# Altium footprint library phoenix.PcbLib: 55 footprints (part 4 of 4)
Each footprint in its own frame and in the unit in brackets; x right, y up, seen from the top. Pads: shape width x height; smd on the part's side, far side on the other; paste and mask are expansions set on the pad; w line width, h text height; cw(c..) or ccw(c..) is an arc to the next point about the centre after c.
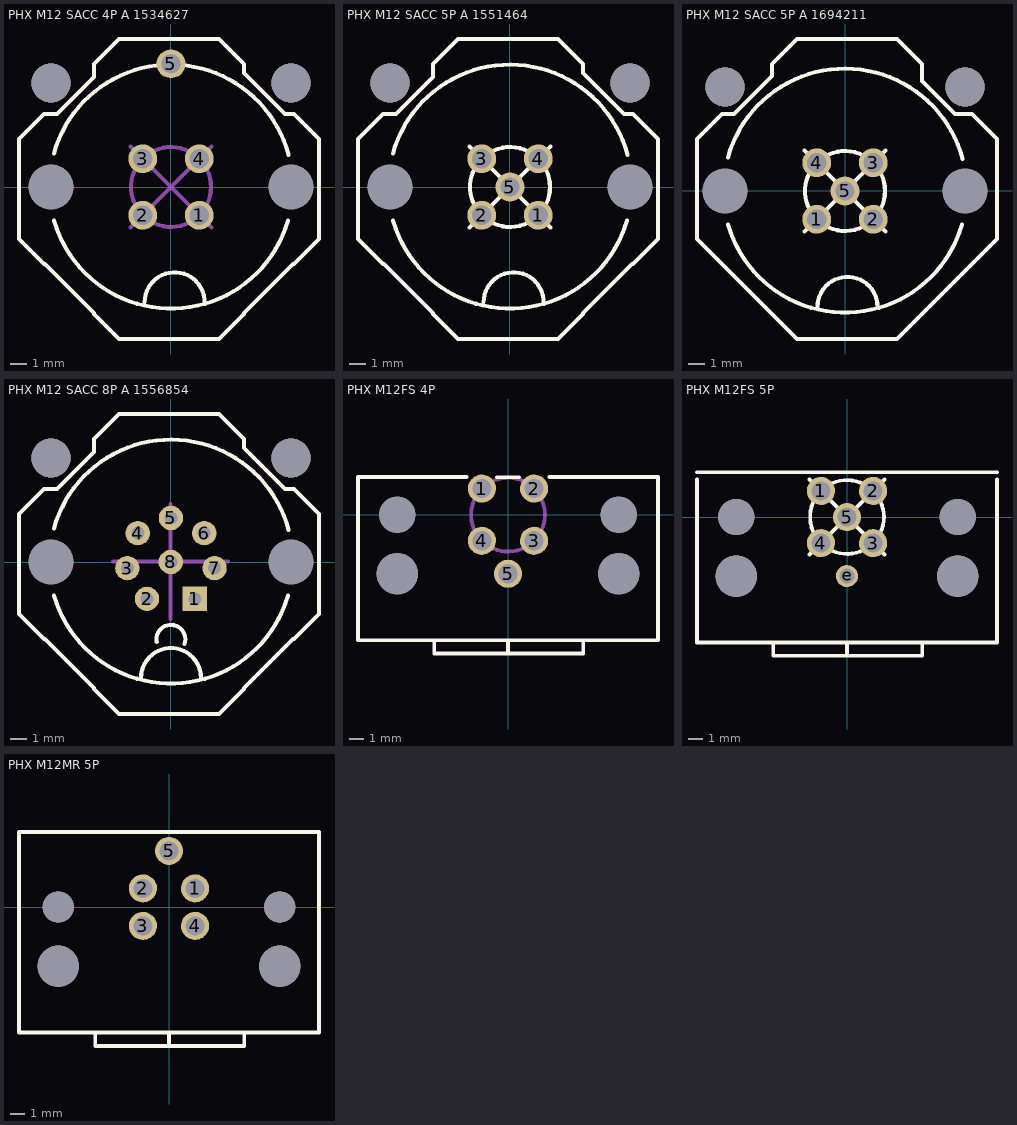
[diagram p3: the footprints below, top view; thin cyan lines are the x and y axes]

## PHX M12 SACC 4P A 1534627 [mm]
pads (9):
  round 1.8 hole 1.2: 1(1.768,-1.768) 2(-1.768,-1.768) 3(-1.768,1.768) 4(1.768,1.768) 5(0,7.7)
  round 2.8 hole 2.8 unplated: ""(-7.5,0) ""(7.5,0)
  round 2.45 hole 2.45 unplated: ""(-7.5,6.5) ""(7.5,6.5)
Top Overlay:
  lines w0.254: -7.322,2.088 cw(c0,0.05) 7.344,2.005 ; -7.303,-2.103 ccw(c0,0) 7.303,-2.104 ; -1.646,-7.204 cw(c0.229,-7.204) 2.104,-7.204 ; -9.5,-3.25 -9.5,3 -7.938,4.563 -7.121,4.563 -4.812,6.872 -4.812,7.687 -3.25,9.25 -0.75,9.25 3,9.25 4.563,7.687 4.563,7.121 7.121,4.563 7.687,4.563 9.25,3 9.25,-3.25 7.687,-4.812 7.634,-4.812 4.563,-7.883 4.563,-7.938 3,-9.5 -3.25,-9.5 -4.812,-7.938 -4.812,-7.888 -7.888,-4.812 -7.938,-4.812 -9.5,-3.25
Mechanical 1:
  circle w0.254: c0,0 r2.5
  lines w0.254: -2.54,-2.54 2.54,2.54 ; -2.54,2.54 2.54,-2.54
3D body "1534627.stp": height 24.01, standoff -5.39, extent -10,-7.5 10,8.5

## PHX M12 SACC 5P A 1551464 [mm]
pads (9):
  round 1.8 hole 1.2: 1(1.768,-1.768) 2(-1.768,-1.768) 3(-1.768,1.768) 4(1.768,1.768) 5(0,0)
  round 2.8 hole 2.8 unplated: ""(-7.5,0) ""(7.5,0)
  round 2.45 hole 2.45 unplated: ""(-7.5,6.5) ""(7.5,6.5)
Top Overlay:
  circle w0.254: c0,0 r2.5
  lines w0.254: -7.322,2.088 cw(c0,0.05) 7.344,2.005 ; -7.303,-2.103 ccw(c0,0) 7.303,-2.104 ; -2.54,-2.54 2.54,2.54 ; -2.54,2.54 2.54,-2.54 ; -1.646,-7.204 cw(c0.229,-7.204) 2.104,-7.204 ; -9.5,-3.25 -9.5,3 -7.938,4.563 -7.121,4.563 -4.812,6.872 -4.812,7.687 -3.25,9.25 -0.75,9.25 3,9.25 4.563,7.687 4.563,7.121 7.121,4.563 7.687,4.563 9.25,3 9.25,-3.25 7.687,-4.812 7.634,-4.812 4.563,-7.883 4.563,-7.938 3,-9.5 -3.25,-9.5 -4.812,-7.938 -4.812,-7.888 -7.888,-4.812 -7.938,-4.812 -9.5,-3.25
3D body "1551464.stp": height 24, standoff -3.5, extent -9.717,-6.834 9.783,8.508

## PHX M12 SACC 5P A 1694211 [mm]
pads (9):
  round 1.8 hole 1.2: 1(-1.768,-1.768) 2(1.768,-1.768) 3(1.768,1.768) 4(-1.768,1.768) 5(0,0)
  round 2.8 hole 2.8 unplated: ""(-7.5,0) ""(7.5,0)
  round 2.45 hole 2.45 unplated: ""(-7.5,6.5) ""(7.5,6.5)
Top Overlay:
  circle w0.254: c0,0 r2.5
  lines w0.254: -7.322,2.088 cw(c0,0.05) 7.344,2.005 ; -7.303,-2.103 ccw(c0,0) 7.303,-2.104 ; -2.54,-2.54 2.54,2.54 ; -2.54,2.54 2.54,-2.54 ; -1.718,-7.239 cw(c0.157,-7.239) 2.032,-7.239 ; -9.25,-3 -9.25,3.25 -7.687,4.812 -6.937,4.812 -4.563,7.187 -4.563,7.938 -3,9.5 3.25,9.5 4.812,7.938 4.812,6.887 6.887,4.812 7.938,4.812 9.5,3.25 9.5,-3 3.25,-9.25 0.75,-9.25 -3,-9.25 -9.25,-3
3D body "1694211.stp": height 23.5, standoff -5.4, extent -9.95,-7.475 10.05,8.525

## PHX M12 SACC 8P A 1556854 [mil] "8 pos M12 Connector"
pads (12):
  rect 60x60 hole 32: 1(58.89,-90.72)
  round 60 hole 32: 2(-59.05,-90.72) 3(-107.3,-14.99) 4(-81.79,71.11) 5(-0.08,108.35) 6(81.63,71.11) 7(107.13,-14.99) 8(-0.45,0)
  round 110.24 hole 110.24 unplated: ""(-295.28,0) ""(295.28,0)
  round 96.46 hole 96.46 unplated: ""(-295.28,255.91) ""(295.28,255.91)
Top Overlay:
  lines w10: -288.25,82.2 cw(c0,1.97) 289.14,78.94 ; -287.53,-82.8 ccw(c0,0) 287.52,-82.84 ; -73.82,-285.43 cw(c0,-285.43) 73.82,-285.43 ; -35.1,-197.27 cw(c-0.33,-190.14) 33.29,-201.51 ; -374.02,-127.95 -374.02,118.11 -312.5,179.63 -280.37,179.63 -189.47,270.53 -189.47,302.66 -127.95,364.17 -29.53,364.17 118.11,364.17 179.63,302.66 179.63,280.37 280.37,179.63 302.66,179.63 364.17,118.11 364.17,-127.95 302.66,-189.47 300.53,-189.47 179.63,-310.37 179.63,-312.5 118.11,-374.02 -127.95,-374.02 -189.47,-312.5 -189.47,-310.53 -310.53,-189.47 -312.5,-189.47 -374.02,-127.95
Mechanical 1:
  lines w10: -142.12,0.7 140.73,0.7 ; -0.7,-140.73 -0.7,142.12
3D body "1556854.stp": height 909.93, standoff -137.32, extent -383.86,-295.28 383.86,334.65

## PHX M12FS 4P [mm] "1534630"
pads (9):
  round 1.905 hole 1.295: 1(-1.768,1.768) 2(1.768,1.768) 3(1.768,-1.768) 4(-1.768,-1.768) 5(0,-4)
  round 2.8 hole 2.8 unplated: ""(-7.5,-4)
  round 2.45 hole 2.45 unplated: ""(-7.5,0) ""(7.5,0)
  round 2.794 hole 2.794 unplated: ""(7.5,-4)
Top Overlay:
  lines w0.254: -5,-8.5 -5,-9.4 5.1,-9.4 5.1,-8.5 ; -2.794,2.548 -10.16,2.548 -10.16,-8.5 10.16,-8.5 10.16,2.54 10.152,2.548 2.794,2.548 ; -0.762,2.54 0.762,2.54 ; 0,-9.4 0,-8.5
Mechanical 1:
  circle w0.254: c0,0 r2.5
3D body "1534630.stp": height 16.01, standoff -3.39, extent -9.75,-23 9.75,2.27

## PHX M12FS 5P [mm] "Right Angle M12 Connector (FIXED 9-12-14)"
pads (10):
  round 1.905 hole 1.295: 1(-1.768,1.768) 2(1.768,1.768) 3(1.768,-1.768) 4(-1.768,-1.768) 5(0,0)
  round 1.5 hole 1: e(0,-4)
  round 2.8 hole 2.8 unplated: ""(-7.5,-4) ""(7.5,-4)
  round 2.45 hole 2.45 unplated: ""(-7.5,0) ""(7.5,0)
Top Overlay:
  circle w0.254: c0,0 r2.5
  lines w0.254: -10.16,2.54 -10.16,-8.5 10.16,-8.5 10.16,2.54 ; -10.16,3.04 10.16,3.04 ; -5,-8.5 -5,-9.4 5.1,-9.4 5.1,-8.5 ; -2.54,-2.54 2.54,2.54 ; -2.54,2.54 2.54,-2.54 ; 0,-9.4 0,-8.5
3D body "1527870.stp": height 3.09, standoff -16.4, extent -9.75,-22.85 9.75,2.25

## PHX M12MR 5P [mil] "Right angle phoenix connector (FIXED 9-12-14)"
pads (9):
  round 75 hole 51: 1(69.6,50) 2(-69.6,50) 3(-69.6,-50) 4(69.6,-50) 5(0,150)
  round 110 hole 110 unplated: ""(-295.28,-157.48) ""(295.28,-157.48)
  round 82.99 hole 83 unplated: ""(-295.28,0) ""(295.28,0)
Top Overlay:
  lines w10: -196.85,-334.65 -196.85,-370.08 200.79,-370.08 200.79,-334.65 ; 0,-370.08 0,-334.65 ; -400,-334.65 400,-334.65 400,200 -400,200 -400,-334.65
3D body "1694224.stp": height 630.28, standoff -224.05, extent -393.7,-885.24 393.7,170.28